# Altium footprint library STM32F0.PcbLib: 228 footprints (part 12 of 16)
Each footprint in its own frame and in the unit in brackets; x right, y up, seen from the top. Pads: shape width x height; smd on the part's side, far side on the other; paste and mask are expansions set on the pad; w line width, h text height; cw(c..) or ccw(c..) is an arc to the next point about the centre after c.
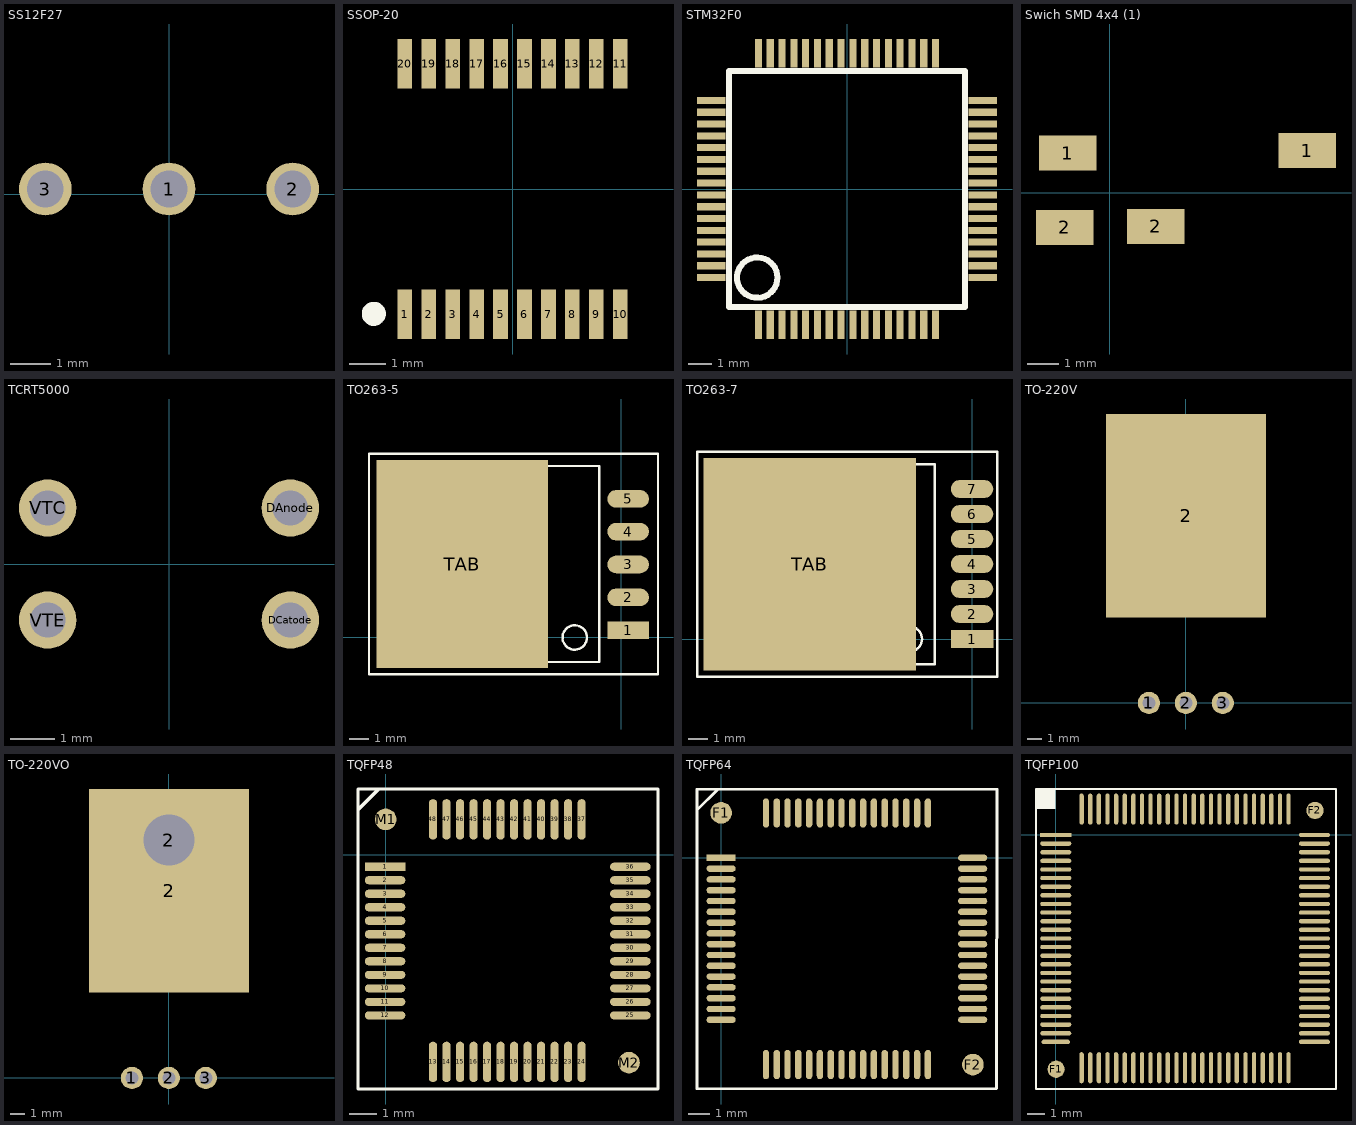
[diagram p11: the footprints below, top view; thin cyan lines are the x and y axes]

## SS12F27 [mm]
pads (3):
  round 1.3 hole 0.9: 1(0,0.127) 2(3.048,0.127) 3(-3.048,0.127)
3D body "User Library-SLIDE SWITCH SS12F23.STEP": height 5.75, standoff -3.35, extent -6.5,-12.138 6.5,0.762

## SSOP-20 [mm]
pads (20):
  rect 0.4x1.35 smd: 1(-2.925,-3.4) 2(-2.275,-3.4) 3(-1.625,-3.4) 4(-0.975,-3.4) 5(-0.325,-3.4) 6(0.325,-3.4) 7(0.975,-3.4) 8(1.625,-3.4) 9(2.275,-3.4) 10(2.925,-3.4) 11(2.925,3.4) 12(2.275,3.4) 13(1.625,3.4) 14(0.975,3.4) 15(0.325,3.4) 16(-0.325,3.4) 17(-0.975,3.4) 18(-1.625,3.4) 19(-2.275,3.4) 20(-2.925,3.4)
Top Overlay:
  circle w0.5: c-3.77,-3.39 r0.076
3D body "User Library-SSOP 20 PIN-1.step": height 1.78, standoff -0.21, extent -3.665,-3.95 3.665,3.95

## STM32F0 [mm]
pads (64):
  rect 0.3x1.2 smd: 1(-3.75,-5.75) 2(-3.25,-5.75) 3(-2.75,-5.75) 4(-2.25,-5.75) 5(-1.75,-5.75) 6(-1.25,-5.75) 7(-0.75,-5.75) 8(-0.25,-5.75) 9(0.25,-5.75) 10(0.75,-5.75) 11(1.25,-5.75) 12(1.75,-5.75) 13(2.25,-5.75) 14(2.75,-5.75) 15(3.25,-5.75) 16(3.75,-5.75) 33(3.75,5.75) 34(3.25,5.75) 35(2.75,5.75) 36(2.25,5.75) 37(1.75,5.75) 38(1.25,5.75) 39(0.75,5.75) 40(0.25,5.75) 41(-0.25,5.75) 42(-0.75,5.75) 43(-1.25,5.75) 44(-1.75,5.75) 45(-2.25,5.75) 46(-2.75,5.75) 47(-3.25,5.75) 48(-3.75,5.75)
  rect 1.2x0.3 smd: 17(5.75,-3.75) 18(5.75,-3.25) 19(5.75,-2.75) 20(5.75,-2.25) 21(5.75,-1.75) 22(5.75,-1.25) 23(5.75,-0.75) 24(5.75,-0.25) 25(5.75,0.25) 26(5.75,0.75) 27(5.75,1.25) 28(5.75,1.75) 29(5.75,2.25) 30(5.75,2.75) 31(5.75,3.25) 32(5.75,3.75) 49(-5.75,3.75) 50(-5.75,3.25) 51(-5.75,2.75) 52(-5.75,2.25) 53(-5.75,1.75) 54(-5.75,1.25) 55(-5.75,0.75) 56(-5.75,0.25) 57(-5.75,-0.25) 58(-5.75,-0.75) 59(-5.75,-1.25) 60(-5.75,-1.75) 61(-5.75,-2.25) 62(-5.75,-2.75) 63(-5.75,-3.25) 64(-5.75,-3.75)
Top Overlay:
  circle w0.254: c-3.8,-3.75 r0.854
  lines w0.254: -5,-5 5,-5 5,5 -5,5 -5,-5
3D body "User Library-LQFP64_Grid_0_5.STEP": height 1.6, standoff 0, extent -6,-6 6,6

## Swich SMD 4x4 (1) [mm]
pads (4):
  rect 1.8x1.1 smd: 1(-1.32,1.25) 1(6.2,1.33) 2(-1.42,-1.08) 2(1.44,-1.05)

## TCRT5000 [mm]
pads (4):
  round 1.3 hole 0.8: DAnode(2.75,1.27) DCatode(2.75,-1.27) VTC(-2.75,1.271) VTE(-2.75,-1.269)
3D body "User Library-TCRT-5000.STEP": height 6.5, standoff -25.41, extent -5.091,-2.898 5.209,2.902

## TO263-5 [mil]
pads (6):
  rect 85x36 smd: 1(14,15)
  oval 85x36 smd: 2(14,82) 3(14,149) 4(14,216) 5(14,283)
  rect 350x425 smd: TAB(-325,150)
Top Overlay:
  circle w5: c-95,0 r25
  lines w4: -45,-50 -451.54,-50 -470,10 -470,285 -445,350 -420,350 -45,350
  lines w5: -420,-50 -420,350 ; -395,-50 -395,350 ; -45,-50 -45,350 ; -515,-75 75,-75 75,375 -515,375 -515,-75
3D body: height 120, standoff 50, extent -393,-50 -82,350
3D body: height 101, standoff 0, extent -287,-49 -200,-17
3D body: height 100, standoff 0, extent -393,-50 -82,350
3D body: height 50, standoff 0, extent -472,-52 -393,350
3D body: height 60, standoff 40, extent -85,270 -5,295
3D body: height 60, standoff 0, extent -17,270 -5,295
3D body: height 20, standoff 0, extent -17,270 31,295
3D body: height 20, standoff 0, extent -17,205 31,230
3D body: height 60, standoff 0, extent -17,205 -5,230
3D body: height 60, standoff 40, extent -85,205 -5,230
3D body: height 20, standoff 0, extent -17,135 31,160
3D body: height 60, standoff 0, extent -17,135 -5,160
3D body: height 60, standoff 40, extent -85,135 -5,160
3D body: height 20, standoff 0, extent -17,70 31,95
3D body: height 60, standoff 0, extent -17,70 -5,95
3D body: height 60, standoff 40, extent -85,70 -5,95
3D body: height 20, standoff 0, extent -17,5 31,30
3D body: height 60, standoff 0, extent -17,5 -5,30
3D body: height 60, standoff 40, extent -85,5 -5,30

## TO263-7 [mil]
pads (8):
  rect 85x36 smd: 1(0,0)
  oval 85x36 smd: 2(0,50) 3(0,100) 4(0,150) 5(0,200) 6(0,250) 7(0,300)
  rect 425x425 smd: TAB(-325,150)
Top Overlay:
  circle w5: c-125,0 r25
  lines w5: -450,-50 -450,350 ; -425,-50 -425,350 ; -550,-75 50,-75 50,375 -550,375 -550,-75 ; -525,-25 -500,-50 -75,-50 -75,350 -500,350 -525,325 -525,-25
3D body: height 120, standoff 50, extent -423,-55 -112,345
3D body: height 101, standoff 0, extent -317,-54 -230,-22
3D body: height 100, standoff 0, extent -423,-55 -112,345
3D body: height 50, standoff 0, extent -502,-57 -423,345

## TO-220V [mil]
pads (4):
  round 60 hole 35.43: 1(-100,0) 2(0,0) 3(100,0)
  rect 433.07x551.18 smd: 2(0.38,506.63)
3D body "CircuitWorks-TO-220.step": height 165.35, standoff -118.11, extent -200,0 200,767.32

## TO-220VO [mm]
pads (5):
  round 1.524 hole 0.9: 1(-2.54,0) 2(0,0) 3(2.54,0)
  round 4.5 hole 3.5: 2(0.006,16.351)
  rect 11x14 smd: 2(0.01,12.868)
3D body "CircuitWorks-TO-220.step": height 4.2, standoff -3, extent -5.08,0 5.08,19.49

## TQFP48 [mm]
pads (50):
  rect 1.5x0.3 smd: 1(-0.025,-0.45)
  oval 1.5x0.3 smd: 2(-0.025,-0.95) 3(-0.025,-1.45) 4(-0.025,-1.95) 5(-0.025,-2.45) 6(-0.025,-2.95) 7(-0.025,-3.45) 8(-0.025,-3.95) 9(-0.025,-4.45) 10(-0.025,-4.95) 11(-0.025,-5.45) 12(-0.025,-5.95) 25(9.05,-5.95) 26(9.05,-5.45) 27(9.05,-4.95) 28(9.05,-4.45) 29(9.05,-3.95) 30(9.05,-3.45) 31(9.05,-2.95) 32(9.05,-2.45) 33(9.05,-1.95) 34(9.05,-1.45) 35(9.05,-0.95) 36(9.05,-0.45)
  oval 0.3x1.5 smd: 13(1.75,-7.675) 14(2.25,-7.675) 15(2.75,-7.675) 16(3.25,-7.675) 17(3.75,-7.675) 18(4.25,-7.675) 19(4.75,-7.675) 20(5.25,-7.675) 21(5.75,-7.675) 22(6.25,-7.675) 23(6.75,-7.675) 24(7.25,-7.675) 37(7.25,1.3) 38(6.75,1.3) 39(6.25,1.3) 40(5.75,1.3) 41(5.25,1.3) 42(4.75,1.3) 43(4.25,1.3) 44(3.75,1.3) 45(3.25,1.3) 46(2.75,1.3) 47(2.25,1.3) 48(1.75,1.3)
  round 0.8 smd: M1(0,1.3) M2(9,-7.7)
Top Overlay:
  lines w0.127: -1.025,1.525 -1.025,1.65 -0.25,2.425 ; -1.025,-8.675 10.075,-8.675 10.075,2.325 10.075,2.425 -1.025,2.425 -1.025,-8.675
3D body: height 0.76, standoff 0.38, extent 0.089,-6.071 0.914,-5.829
3D body: height 0.51, standoff 0, extent -0.254,-6.071 0.432,-5.829
3D body: height 0.97, standoff 0.13, extent 0.902,-6.744 8.141,0.419
3D body: height 0.51, standoff 0, extent -0.254,-5.556 0.432,-5.315
3D body: height 0.76, standoff 0.38, extent 0.089,-5.556 0.914,-5.315
3D body: height 0.51, standoff 0, extent -0.254,-5.074 0.432,-4.832
3D body: height 0.76, standoff 0.38, extent 0.089,-5.074 0.914,-4.832
3D body: height 0.51, standoff 0, extent -0.254,-4.566 0.432,-4.324
3D body: height 0.76, standoff 0.38, extent 0.089,-4.566 0.914,-4.324
3D body: height 0.51, standoff 0, extent -0.254,-4.083 0.432,-3.842
3D body: height 0.76, standoff 0.38, extent 0.089,-4.083 0.914,-3.842
3D body: height 0.51, standoff 0, extent -0.254,-3.575 0.432,-3.334
3D body: height 0.76, standoff 0.38, extent 0.089,-3.575 0.914,-3.334
3D body: height 0.51, standoff 0, extent -0.254,-3.067 0.432,-2.826
3D body: height 0.76, standoff 0.38, extent 0.089,-3.067 0.914,-2.826
3D body: height 0.51, standoff 0, extent -0.254,-2.584 0.432,-2.343
3D body: height 0.76, standoff 0.38, extent 0.089,-2.584 0.914,-2.343
3D body: height 0.51, standoff 0, extent -0.254,-2.076 0.432,-1.835
3D body: height 0.76, standoff 0.38, extent 0.089,-2.076 0.914,-1.835
3D body: height 0.51, standoff 0, extent -0.254,-1.568 0.432,-1.327
3D body: height 0.76, standoff 0.38, extent 0.089,-1.568 0.914,-1.327
3D body: height 0.51, standoff 0, extent -0.254,-1.086 0.432,-0.845
3D body: height 0.76, standoff 0.38, extent 0.089,-1.086 0.914,-0.845
3D body: height 0.51, standoff 0, extent -0.254,-0.578 0.432,-0.337
3D body: height 0.76, standoff 0.38, extent 0.089,-0.578 0.914,-0.337
3D body: height 0.76, standoff 0.38, extent 1.632,-7.556 1.873,-6.731
3D body: height 0.51, standoff 0, extent 1.632,-7.899 1.873,-7.214
3D body: height 0.76, standoff 0.38, extent 2.14,-7.556 2.381,-6.731
3D body: height 0.51, standoff 0, extent 2.14,-7.899 2.381,-7.214
3D body: height 0.76, standoff 0.38, extent 2.623,-7.556 2.864,-6.731
3D body: height 0.51, standoff 0, extent 2.623,-7.899 2.864,-7.214
3D body: height 0.76, standoff 0.38, extent 3.131,-7.556 3.372,-6.731
3D body: height 0.51, standoff 0, extent 3.131,-7.899 3.372,-7.214
3D body: height 0.76, standoff 0.38, extent 3.639,-7.556 3.88,-6.731
3D body: height 0.51, standoff 0, extent 3.639,-7.899 3.88,-7.214
3D body: height 0.76, standoff 0.38, extent 4.121,-7.556 4.362,-6.731
3D body: height 0.51, standoff 0, extent 4.121,-7.899 4.362,-7.214
3D body: height 0.76, standoff 0.38, extent 4.629,-7.556 4.87,-6.731
3D body: height 0.51, standoff 0, extent 4.629,-7.899 4.87,-7.214
3D body: height 0.76, standoff 0.38, extent 5.137,-7.556 5.378,-6.731
3D body: height 0.51, standoff 0, extent 5.137,-7.899 5.378,-7.214
3D body: height 0.76, standoff 0.38, extent 5.62,-7.556 5.861,-6.731
3D body: height 0.51, standoff 0, extent 5.62,-7.899 5.861,-7.214
3D body: height 0.76, standoff 0.38, extent 6.128,-7.556 6.369,-6.731
3D body: height 0.51, standoff 0, extent 6.128,-7.899 6.369,-7.214
3D body: height 0.76, standoff 0.38, extent 6.61,-7.556 6.852,-6.731
3D body: height 0.51, standoff 0, extent 6.61,-7.899 6.852,-7.214
3D body: height 0.51, standoff 0, extent 7.125,-7.899 7.366,-7.214
3D body: height 0.76, standoff 0.38, extent 7.125,-7.556 7.366,-6.731
3D body: height 0.76, standoff 0.38, extent 8.103,-6.064 8.928,-5.823
3D body: height 0.51, standoff 0, extent 8.585,-6.064 9.271,-5.823
3D body: height 0.76, standoff 0.38, extent 8.103,-5.556 8.928,-5.315
3D body: height 0.51, standoff 0, extent 8.585,-5.556 9.271,-5.315
3D body: height 0.76, standoff 0.38, extent 8.103,-5.074 8.928,-4.832
3D body: height 0.51, standoff 0, extent 8.585,-5.074 9.271,-4.832
3D body: height 0.76, standoff 0.38, extent 8.103,-4.566 8.928,-4.324
3D body: height 0.51, standoff 0, extent 8.585,-4.566 9.271,-4.324
3D body: height 0.76, standoff 0.38, extent 8.103,-4.058 8.928,-3.816
3D body: height 0.51, standoff 0, extent 8.585,-4.058 9.271,-3.816
3D body: height 0.76, standoff 0.38, extent 8.103,-3.575 8.928,-3.334
3D body: height 0.51, standoff 0, extent 8.585,-3.575 9.271,-3.334
3D body: height 0.76, standoff 0.38, extent 8.103,-3.067 8.928,-2.826
3D body: height 0.51, standoff 0, extent 8.585,-3.067 9.271,-2.826
3D body: height 0.76, standoff 0.38, extent 8.103,-2.559 8.928,-2.318
3D body: height 0.51, standoff 0, extent 8.585,-2.559 9.271,-2.318
3D body: height 0.76, standoff 0.38, extent 8.103,-2.076 8.928,-1.835
3D body: height 0.51, standoff 0, extent 8.585,-2.076 9.271,-1.835
3D body: height 0.76, standoff 0.38, extent 8.103,-1.568 8.928,-1.327
3D body: height 0.51, standoff 0, extent 8.585,-1.568 9.271,-1.327
3D body: height 0.76, standoff 0.38, extent 8.103,-1.086 8.928,-0.845
3D body: height 0.51, standoff 0, extent 8.585,-1.086 9.271,-0.845
3D body: height 0.51, standoff 0, extent 8.585,-0.572 9.271,-0.33
3D body: height 0.76, standoff 0.38, extent 8.103,-0.572 8.928,-0.33
3D body: height 0.76, standoff 0.38, extent 7.118,0.381 7.36,1.206
3D body: height 0.51, standoff 0, extent 7.118,0.864 7.36,1.549
3D body: height 0.76, standoff 0.38, extent 6.61,0.381 6.852,1.206
3D body: height 0.51, standoff 0, extent 6.61,0.864 6.852,1.549
3D body: height 0.76, standoff 0.38, extent 6.128,0.381 6.369,1.206
3D body: height 0.51, standoff 0, extent 6.128,0.864 6.369,1.549
3D body: height 0.76, standoff 0.38, extent 5.62,0.381 5.861,1.206
3D body: height 0.51, standoff 0, extent 5.62,0.864 5.861,1.549
3D body: height 0.76, standoff 0.38, extent 5.112,0.381 5.353,1.206
3D body: height 0.51, standoff 0, extent 5.112,0.864 5.353,1.549
3D body: height 0.76, standoff 0.38, extent 4.629,0.381 4.87,1.206
3D body: height 0.51, standoff 0, extent 4.629,0.864 4.87,1.549
3D body: height 0.76, standoff 0.38, extent 4.121,0.381 4.362,1.206
3D body: height 0.51, standoff 0, extent 4.121,0.864 4.362,1.549
3D body: height 0.76, standoff 0.38, extent 3.613,0.381 3.854,1.206
3D body: height 0.51, standoff 0, extent 3.613,0.864 3.854,1.549
3D body: height 0.76, standoff 0.38, extent 3.131,0.381 3.372,1.206
3D body: height 0.51, standoff 0, extent 3.131,0.864 3.372,1.549
3D body: height 0.76, standoff 0.38, extent 2.623,0.381 2.864,1.206
3D body: height 0.51, standoff 0, extent 2.623,0.864 2.864,1.549
3D body: height 0.76, standoff 0.38, extent 2.14,0.381 2.381,1.206
3D body: height 0.51, standoff 0, extent 2.14,0.864 2.381,1.549
3D body: height 0.51, standoff 0, extent 1.626,0.864 1.867,1.549
3D body: height 0.76, standoff 0.38, extent 1.626,0.381 1.867,1.206
3D body: height 0.99, standoff 0.25, extent 1.295,-0.483 1.801,0.024

## TQFP64 [mm]
pads (66):
  rect 1.35x0.295 smd: 1(0,0)
  oval 1.35x0.295 smd: 2(0,-0.5) 3(0,-1) 4(0,-1.5) 5(0,-2) 6(0,-2.5) 7(0,-3) 8(0,-3.5) 9(0,-4) 10(0,-4.5) 11(0,-5) 12(0,-5.5) 13(0,-6) 14(0,-6.5) 15(0,-7) 16(0,-7.5) 33(11.65,-7.5) 34(11.65,-7) 35(11.65,-6.5) 36(11.65,-6) 37(11.65,-5.5) 38(11.65,-5) 39(11.65,-4.5) 40(11.65,-4) 41(11.65,-3.5) 42(11.65,-3) 43(11.65,-2.5) 44(11.65,-2) 45(11.65,-1.5) 46(11.65,-1) 47(11.65,-0.5) 48(11.65,0)
  oval 0.295x1.35 smd: 17(2.075,-9.575) 18(2.575,-9.575) 19(3.075,-9.575) 20(3.575,-9.575) 21(4.075,-9.575) 22(4.575,-9.575) 23(5.075,-9.575) 24(5.575,-9.575) 25(6.075,-9.575) 26(6.575,-9.575) 27(7.075,-9.575) 28(7.575,-9.575) 29(8.075,-9.575) 30(8.575,-9.575) 31(9.075,-9.575) 32(9.575,-9.575) 49(9.575,2.075) 50(9.075,2.075) 51(8.575,2.075) 52(8.075,2.075) 53(7.575,2.075) 54(7.075,2.075) 55(6.575,2.075) 56(6.075,2.075) 57(5.575,2.075) 58(5.075,2.075) 59(4.575,2.075) 60(4.075,2.075) 61(3.575,2.075) 62(3.075,2.075) 63(2.575,2.075) 64(2.075,2.075)
  round 1 smd: F1(0,2.083) F2(11.659,-9.576)
Top Overlay:
  lines w0.127: -1.118,2.007 -1.118,2.21 -0.152,3.175 ; -1.118,-10.693 12.757,-10.682 12.776,3.175 -1.067,3.175 -1.118,3.175 -1.118,-10.693
3D body: height 0.99, standoff 0.25, extent 1.449,0.127 1.955,0.634
3D body: height 0.76, standoff 0.38, extent 0.14,-0.121 0.965,0.121
3D body: height 0.51, standoff 0, extent -0.203,-0.121 0.483,0.121
3D body: height 0.76, standoff 0.38, extent 0.14,-0.629 0.965,-0.387
3D body: height 0.51, standoff 0, extent -0.203,-0.629 0.483,-0.387
3D body: height 0.76, standoff 0.38, extent 0.14,-1.111 0.965,-0.87
3D body: height 0.51, standoff 0, extent -0.203,-1.111 0.483,-0.87
3D body: height 0.76, standoff 0.38, extent 0.14,-1.619 0.965,-1.378
3D body: height 0.51, standoff 0, extent -0.203,-1.619 0.483,-1.378
3D body: height 0.76, standoff 0.38, extent 0.14,-2.127 0.965,-1.886
3D body: height 0.51, standoff 0, extent -0.203,-2.127 0.483,-1.886
3D body: height 0.76, standoff 0.38, extent 0.14,-2.61 0.965,-2.369
3D body: height 0.51, standoff 0, extent -0.203,-2.61 0.483,-2.369
3D body: height 0.76, standoff 0.38, extent 0.14,-3.118 0.965,-2.877
3D body: height 0.51, standoff 0, extent -0.203,-3.118 0.483,-2.877
3D body: height 0.76, standoff 0.38, extent 0.14,-3.626 0.965,-3.385
3D body: height 0.51, standoff 0, extent -0.203,-3.626 0.483,-3.385
3D body: height 0.76, standoff 0.38, extent 0.14,-4.108 0.965,-3.867
3D body: height 0.51, standoff 0, extent -0.203,-4.108 0.483,-3.867
3D body: height 0.76, standoff 0.38, extent 0.14,-4.616 0.965,-4.375
3D body: height 0.51, standoff 0, extent -0.203,-4.616 0.483,-4.375
3D body: height 0.76, standoff 0.38, extent 0.14,-5.099 0.965,-4.858
3D body: height 0.51, standoff 0, extent -0.203,-5.099 0.483,-4.858
3D body: height 0.97, standoff 0.13, extent 0.94,-8.661 10.693,1.143
3D body: height 0.51, standoff 0, extent -0.203,-5.613 0.483,-5.372
3D body: height 0.76, standoff 0.38, extent 0.14,-5.613 0.965,-5.372
3D body: height 0.76, standoff 0.38, extent 0.14,-7.62 0.965,-7.379
3D body: height 0.51, standoff 0, extent -0.203,-7.62 0.483,-7.379
3D body: height 0.51, standoff 0, extent -0.203,-7.106 0.483,-6.864
3D body: height 0.76, standoff 0.38, extent 0.14,-7.106 0.965,-6.864
3D body: height 0.51, standoff 0, extent -0.203,-6.623 0.483,-6.382
3D body: height 0.76, standoff 0.38, extent 0.14,-6.623 0.965,-6.382
3D body: height 0.51, standoff 0, extent -0.203,-6.115 0.483,-5.874
3D body: height 0.76, standoff 0.38, extent 0.14,-6.115 0.965,-5.874
3D body: height 0.76, standoff 0.38, extent 7.931,-9.461 8.172,-8.636
3D body: height 0.51, standoff 0, extent 7.931,-9.804 8.172,-9.119
3D body: height 0.76, standoff 0.38, extent 8.439,-9.461 8.68,-8.636
3D body: height 0.51, standoff 0, extent 8.439,-9.804 8.68,-9.119
3D body: height 0.76, standoff 0.38, extent 8.922,-9.461 9.163,-8.636
3D body: height 0.51, standoff 0, extent 8.922,-9.804 9.163,-9.119
3D body: height 0.51, standoff 0, extent 9.436,-9.804 9.677,-9.119
3D body: height 0.76, standoff 0.38, extent 9.436,-9.461 9.677,-8.636
3D body: height 0.76, standoff 0.38, extent 7.429,-9.461 7.671,-8.636
3D body: height 0.51, standoff 0, extent 7.429,-9.804 7.671,-9.119
3D body: height 0.51, standoff 0, extent 6.915,-9.804 7.156,-9.119
3D body: height 0.76, standoff 0.38, extent 6.915,-9.461 7.156,-8.636
3D body: height 0.51, standoff 0, extent 6.433,-9.804 6.674,-9.119
3D body: height 0.76, standoff 0.38, extent 6.433,-9.461 6.674,-8.636
3D body: height 0.51, standoff 0, extent 5.925,-9.804 6.166,-9.119
3D body: height 0.76, standoff 0.38, extent 5.925,-9.461 6.166,-8.636
3D body: height 0.51, standoff 0, extent 5.442,-9.804 5.683,-9.119
3D body: height 0.76, standoff 0.38, extent 5.442,-9.461 5.683,-8.636
3D body: height 0.51, standoff 0, extent 4.934,-9.804 5.175,-9.119
3D body: height 0.76, standoff 0.38, extent 4.934,-9.461 5.175,-8.636
3D body: height 0.51, standoff 0, extent 4.426,-9.804 4.667,-9.119
3D body: height 0.76, standoff 0.38, extent 4.426,-9.461 4.667,-8.636
3D body: height 0.51, standoff 0, extent 3.943,-9.804 4.185,-9.119
3D body: height 0.76, standoff 0.38, extent 3.943,-9.461 4.185,-8.636
3D body: height 0.51, standoff 0, extent 3.435,-9.804 3.677,-9.119
3D body: height 0.76, standoff 0.38, extent 3.435,-9.461 3.677,-8.636
3D body: height 0.51, standoff 0, extent 2.927,-9.804 3.169,-9.119
3D body: height 0.76, standoff 0.38, extent 2.927,-9.461 3.169,-8.636
3D body: height 0.51, standoff 0, extent 2.445,-9.804 2.686,-9.119
3D body: height 0.76, standoff 0.38, extent 2.445,-9.461 2.686,-8.636
3D body: height 0.51, standoff 0, extent 1.937,-9.804 2.178,-9.119
3D body: height 0.76, standoff 0.38, extent 1.937,-9.461 2.178,-8.636
3D body: height 0.76, standoff 0.38, extent 10.668,-1.619 11.493,-1.378
3D body: height 0.51, standoff 0, extent 11.151,-1.619 11.836,-1.378
3D body: height 0.76, standoff 0.38, extent 10.668,-1.111 11.493,-0.87
3D body: height 0.51, standoff 0, extent 11.151,-1.111 11.836,-0.87
3D body: height 0.76, standoff 0.38, extent 10.668,-0.629 11.493,-0.387
3D body: height 0.51, standoff 0, extent 11.151,-0.629 11.836,-0.387
3D body: height 0.51, standoff 0, extent 11.151,-0.114 11.836,0.127
3D body: height 0.76, standoff 0.38, extent 10.668,-0.114 11.493,0.127
3D body: height 0.76, standoff 0.38, extent 10.668,-2.121 11.493,-1.88
3D body: height 0.51, standoff 0, extent 11.151,-2.121 11.836,-1.88
3D body: height 0.51, standoff 0, extent 11.151,-2.635 11.836,-2.394
3D body: height 0.76, standoff 0.38, extent 10.668,-2.635 11.493,-2.394
3D body: height 0.51, standoff 0, extent 11.151,-3.118 11.836,-2.877
3D body: height 0.76, standoff 0.38, extent 10.668,-3.118 11.493,-2.877
3D body: height 0.51, standoff 0, extent 11.151,-3.626 11.836,-3.385
3D body: height 0.76, standoff 0.38, extent 10.668,-3.626 11.493,-3.385
3D body: height 0.51, standoff 0, extent 11.151,-4.108 11.836,-3.867
3D body: height 0.76, standoff 0.38, extent 10.668,-4.108 11.493,-3.867
3D body: height 0.51, standoff 0, extent 11.151,-4.616 11.836,-4.375
3D body: height 0.76, standoff 0.38, extent 10.668,-4.616 11.493,-4.375
3D body: height 0.51, standoff 0, extent 11.151,-5.124 11.836,-4.883
3D body: height 0.76, standoff 0.38, extent 10.668,-5.124 11.493,-4.883
3D body: height 0.51, standoff 0, extent 11.151,-5.607 11.836,-5.366
3D body: height 0.76, standoff 0.38, extent 10.668,-5.607 11.493,-5.366
3D body: height 0.51, standoff 0, extent 11.151,-6.115 11.836,-5.874
3D body: height 0.76, standoff 0.38, extent 10.668,-6.115 11.493,-5.874
3D body: height 0.51, standoff 0, extent 11.151,-6.623 11.836,-6.382
3D body: height 0.76, standoff 0.38, extent 10.668,-6.623 11.493,-6.382
3D body: height 0.51, standoff 0, extent 11.151,-7.106 11.836,-6.864
3D body: height 0.76, standoff 0.38, extent 10.668,-7.106 11.493,-6.864
3D body: height 0.51, standoff 0, extent 11.151,-7.614 11.836,-7.372
3D body: height 0.76, standoff 0.38, extent 10.668,-7.614 11.493,-7.372
3D body: height 0.76, standoff 0.38, extent 3.461,1.118 3.702,1.943
3D body: height 0.51, standoff 0, extent 3.461,1.6 3.702,2.286
3D body: height 0.76, standoff 0.38, extent 2.953,1.118 3.194,1.943
3D body: height 0.51, standoff 0, extent 2.953,1.6 3.194,2.286
3D body: height 0.76, standoff 0.38, extent 2.47,1.118 2.711,1.943
3D body: height 0.51, standoff 0, extent 2.47,1.6 2.711,2.286
3D body: height 0.51, standoff 0, extent 1.956,1.6 2.197,2.286
3D body: height 0.76, standoff 0.38, extent 1.956,1.118 2.197,1.943
3D body: height 0.76, standoff 0.38, extent 3.962,1.118 4.204,1.943
3D body: height 0.51, standoff 0, extent 3.962,1.6 4.204,2.286
3D body: height 0.51, standoff 0, extent 4.477,1.6 4.718,2.286
3D body: height 0.76, standoff 0.38, extent 4.477,1.118 4.718,1.943
3D body: height 0.51, standoff 0, extent 4.959,1.6 5.201,2.286
3D body: height 0.76, standoff 0.38, extent 4.959,1.118 5.201,1.943
3D body: height 0.51, standoff 0, extent 5.467,1.6 5.709,2.286
3D body: height 0.76, standoff 0.38, extent 5.467,1.118 5.709,1.943
3D body: height 0.51, standoff 0, extent 5.95,1.6 6.191,2.286
3D body: height 0.76, standoff 0.38, extent 5.95,1.118 6.191,1.943
3D body: height 0.51, standoff 0, extent 6.458,1.6 6.699,2.286
3D body: height 0.76, standoff 0.38, extent 6.458,1.118 6.699,1.943
3D body: height 0.51, standoff 0, extent 6.966,1.6 7.207,2.286
3D body: height 0.76, standoff 0.38, extent 6.966,1.118 7.207,1.943
3D body: height 0.51, standoff 0, extent 7.449,1.6 7.69,2.286
3D body: height 0.76, standoff 0.38, extent 7.449,1.118 7.69,1.943
3D body: height 0.51, standoff 0, extent 7.957,1.6 8.198,2.286
3D body: height 0.76, standoff 0.38, extent 7.957,1.118 8.198,1.943
3D body: height 0.51, standoff 0, extent 8.465,1.6 8.706,2.286
3D body: height 0.76, standoff 0.38, extent 8.465,1.118 8.706,1.943
3D body: height 0.51, standoff 0, extent 8.947,1.6 9.188,2.286
3D body: height 0.76, standoff 0.38, extent 8.947,1.118 9.188,1.943
3D body: height 0.51, standoff 0, extent 9.455,1.6 9.696,2.286
3D body: height 0.76, standoff 0.38, extent 9.455,1.118 9.696,1.943

## TQFP100 [mm]
pads (102):
  rect 1.8x0.25 smd: 1(0,0)
  oval 1.8x0.25 smd: 2(0,-0.5) 3(0,-1) 4(0,-1.5) 5(0,-2) 6(0,-2.5) 7(0,-3) 8(0,-3.5) 9(0,-4) 10(0,-4.5) 11(0,-5) 12(0,-5.5) 13(0,-6) 14(0,-6.5) 15(0,-7) 16(0,-7.5) 17(0,-8) 18(0,-8.5) 19(0,-9) 20(0,-9.5) 21(0,-10) 22(0,-10.5) 23(0,-11) 24(0,-11.5) 51(15,-12) 52(15,-11.5) 53(15,-11) 54(15,-10.5) 55(15,-10) 56(15,-9.5) 57(15,-9) 58(15,-8.5) 59(15,-8) 60(15,-7.5) 61(15,-7) 62(15,-6.5) 63(15,-6) 64(15,-5.5) 65(15,-5) 66(15,-4.5) 67(15,-4) 68(15,-3.5) 69(15,-3) 70(15,-2.5) 71(15,-2) 72(15,-1.5) 73(15,-1) 74(15,-0.5) 75(15,0)
  oval 1.651x0.25 smd: 25(0,-12)
  oval 0.25x1.8 smd: 26(1.5,-13.5) 27(2,-13.5) 28(2.5,-13.5) 29(3,-13.5) 30(3.5,-13.5) 31(4,-13.5) 32(4.5,-13.5) 33(5,-13.5) 34(5.5,-13.5) 35(6,-13.5) 36(6.5,-13.5) 37(7,-13.5) 38(7.5,-13.5) 39(8,-13.5) 40(8.5,-13.5) 41(9,-13.5) 42(9.5,-13.5) 43(10,-13.5) 44(10.5,-13.5) 45(11,-13.5) 46(11.5,-13.5) 47(12,-13.5) 48(12.5,-13.5) 49(13,-13.5) 50(13.5,-13.5) 76(13.5,1.5) 77(13,1.5) 78(12.5,1.5) 79(12,1.5) 80(11.5,1.5) 81(11,1.5) 82(10.5,1.5) 83(10,1.5) 84(9.5,1.5) 85(9,1.5) 86(8.5,1.5) 87(8,1.5) 88(7.5,1.5) 89(7,1.5) 90(6.5,1.5) 91(6,1.5) 92(5.5,1.5) 93(5,1.5) 94(4.5,1.5) 95(4,1.5) 96(3.5,1.5) 97(3,1.5) 98(2.5,1.5) 99(2,1.5) 100(1.5,1.5)
  round 1 smd: F1(0.022,-13.586) F2(15.033,1.425)
Top Overlay:
  rectangle: -1.146,1.499 -0.025,2.667
  lines w0.127: -0.511,2.667 -1.146,2.032 -1.146,2.159 -0.638,2.667 -0.765,2.667 -1.146,2.286 -1.146,2.413 -0.892,2.667 -1.146,2.667 ; -1.146,2.667 16.253,2.667 16.253,-14.732 -1.146,-14.732 -1.146,2.667
3D body: height 0.3, standoff 0, extent 13.353,1.191 13.658,1.75
3D body: height 0.64, standoff 0.3, extent 13.353,0.582 13.658,1.407
3D body: height 0.3, standoff 0, extent 10.353,1.191 10.658,1.75
3D body: height 0.64, standoff 0.3, extent 10.353,0.582 10.658,1.407
3D body: height 0.3, standoff 0, extent 10.853,1.191 11.158,1.75
3D body: height 0.64, standoff 0.3, extent 10.853,0.582 11.158,1.407
3D body: height 0.3, standoff 0, extent 11.353,1.191 11.658,1.75
3D body: height 0.64, standoff 0.3, extent 11.353,0.582 11.658,1.407
3D body: height 0.3, standoff 0, extent 11.853,1.191 12.158,1.75
3D body: height 0.64, standoff 0.3, extent 11.853,0.582 12.158,1.407
3D body: height 0.3, standoff 0, extent 12.353,1.191 12.658,1.75
3D body: height 0.64, standoff 0.3, extent 12.353,0.582 12.658,1.407
3D body: height 0.64, standoff 0.3, extent 12.853,0.582 13.158,1.407
3D body: height 0.3, standoff 0, extent 12.853,1.191 13.158,1.75
3D body: height 0.3, standoff 0, extent 7.353,1.191 7.658,1.75
3D body: height 0.64, standoff 0.3, extent 7.353,0.582 7.658,1.407
3D body: height 0.3, standoff 0, extent 7.853,1.191 8.158,1.75
3D body: height 0.64, standoff 0.3, extent 7.853,0.582 8.158,1.407
3D body: height 0.3, standoff 0, extent 8.353,1.191 8.658,1.75
3D body: height 0.64, standoff 0.3, extent 8.353,0.582 8.658,1.407
3D body: height 0.3, standoff 0, extent 8.853,1.191 9.158,1.75
3D body: height 0.64, standoff 0.3, extent 8.853,0.582 9.158,1.407
3D body: height 0.3, standoff 0, extent 9.353,1.191 9.658,1.75
3D body: height 0.64, standoff 0.3, extent 9.353,0.582 9.658,1.407
3D body: height 0.64, standoff 0.3, extent 9.853,0.582 10.158,1.407
3D body: height 0.3, standoff 0, extent 9.853,1.191 10.158,1.75
3D body: height 0.3, standoff 0, extent 4.353,1.191 4.658,1.75
3D body: height 0.64, standoff 0.3, extent 4.353,0.582 4.658,1.407
3D body: height 0.3, standoff 0, extent 4.853,1.191 5.158,1.75
3D body: height 0.64, standoff 0.3, extent 4.853,0.582 5.158,1.407
3D body: height 0.3, standoff 0, extent 5.353,1.191 5.658,1.75
3D body: height 0.64, standoff 0.3, extent 5.353,0.582 5.658,1.407
3D body: height 0.3, standoff 0, extent 5.853,1.191 6.158,1.75
3D body: height 0.64, standoff 0.3, extent 5.853,0.582 6.158,1.407
3D body: height 0.3, standoff 0, extent 6.353,1.191 6.658,1.75
3D body: height 0.64, standoff 0.3, extent 6.353,0.582 6.658,1.407
3D body: height 0.64, standoff 0.3, extent 6.853,0.582 7.158,1.407
3D body: height 0.3, standoff 0, extent 6.853,1.191 7.158,1.75
3D body: height 0.3, standoff 0, extent 1.353,1.191 1.658,1.75
3D body: height 0.64, standoff 0.3, extent 1.353,0.582 1.658,1.407
3D body: height 0.3, standoff 0, extent 1.853,1.191 2.158,1.75
3D body: height 0.64, standoff 0.3, extent 1.853,0.582 2.158,1.407
3D body: height 0.3, standoff 0, extent 2.353,1.191 2.658,1.75
3D body: height 0.64, standoff 0.3, extent 2.353,0.582 2.658,1.407
3D body: height 0.3, standoff 0, extent 2.853,1.191 3.158,1.75
3D body: height 0.64, standoff 0.3, extent 2.853,0.582 3.158,1.407
3D body: height 0.3, standoff 0, extent 3.353,1.191 3.658,1.75
3D body: height 0.64, standoff 0.3, extent 3.353,0.582 3.658,1.407
3D body: height 0.64, standoff 0.3, extent 3.853,0.582 4.158,1.407
3D body: height 0.3, standoff 0, extent 3.853,1.191 4.158,1.75
3D body: height 0.3, standoff 0, extent 14.675,-12.162 15.234,-11.857
3D body: height 0.64, standoff 0.3, extent 14.066,-12.162 14.891,-11.857
3D body: height 0.3, standoff 0, extent 14.675,-9.162 15.234,-8.857
3D body: height 0.64, standoff 0.3, extent 14.066,-9.162 14.891,-8.857
3D body: height 0.3, standoff 0, extent 14.675,-9.662 15.234,-9.357
3D body: height 0.64, standoff 0.3, extent 14.066,-9.662 14.891,-9.357
3D body: height 0.3, standoff 0, extent 14.675,-10.162 15.234,-9.857
3D body: height 0.64, standoff 0.3, extent 14.066,-10.162 14.891,-9.857
3D body: height 0.3, standoff 0, extent 14.675,-10.662 15.234,-10.357
3D body: height 0.64, standoff 0.3, extent 14.066,-10.662 14.891,-10.357
3D body: height 0.3, standoff 0, extent 14.675,-11.162 15.234,-10.857
3D body: height 0.64, standoff 0.3, extent 14.066,-11.162 14.891,-10.857
3D body: height 0.64, standoff 0.3, extent 14.066,-11.662 14.891,-11.357
3D body: height 0.3, standoff 0, extent 14.675,-11.662 15.234,-11.357
3D body: height 0.3, standoff 0, extent 14.675,-6.162 15.234,-5.857
3D body: height 0.64, standoff 0.3, extent 14.066,-6.162 14.891,-5.857
3D body: height 0.3, standoff 0, extent 14.675,-6.662 15.234,-6.357
3D body: height 0.64, standoff 0.3, extent 14.066,-6.662 14.891,-6.357
3D body: height 0.3, standoff 0, extent 14.675,-7.162 15.234,-6.857
3D body: height 0.64, standoff 0.3, extent 14.066,-7.162 14.891,-6.857
3D body: height 0.3, standoff 0, extent 14.675,-7.662 15.234,-7.357
3D body: height 0.64, standoff 0.3, extent 14.066,-7.662 14.891,-7.357
3D body: height 0.3, standoff 0, extent 14.675,-8.162 15.234,-7.857
3D body: height 0.64, standoff 0.3, extent 14.066,-8.162 14.891,-7.857
3D body: height 0.64, standoff 0.3, extent 14.066,-8.662 14.891,-8.357
3D body: height 0.3, standoff 0, extent 14.675,-8.662 15.234,-8.357
3D body: height 0.3, standoff 0, extent 14.675,-3.162 15.234,-2.857
3D body: height 0.64, standoff 0.3, extent 14.066,-3.162 14.891,-2.857
3D body: height 0.3, standoff 0, extent 14.675,-3.662 15.234,-3.357
3D body: height 0.64, standoff 0.3, extent 14.066,-3.662 14.891,-3.357
3D body: height 0.3, standoff 0, extent 14.675,-4.162 15.234,-3.857
3D body: height 0.64, standoff 0.3, extent 14.066,-4.162 14.891,-3.857
3D body: height 0.3, standoff 0, extent 14.675,-4.662 15.234,-4.357
3D body: height 0.64, standoff 0.3, extent 14.066,-4.662 14.891,-4.357
3D body: height 0.3, standoff 0, extent 14.675,-5.162 15.234,-4.857
3D body: height 0.64, standoff 0.3, extent 14.066,-5.162 14.891,-4.857
3D body: height 0.64, standoff 0.3, extent 14.066,-5.662 14.891,-5.357
3D body: height 0.3, standoff 0, extent 14.675,-5.662 15.234,-5.357
3D body: height 0.3, standoff 0, extent 14.675,-0.162 15.234,0.143
3D body: height 0.64, standoff 0.3, extent 14.066,-0.162 14.891,0.143
3D body: height 0.3, standoff 0, extent 14.675,-0.662 15.234,-0.357
3D body: height 0.64, standoff 0.3, extent 14.066,-0.662 14.891,-0.357
3D body: height 0.3, standoff 0, extent 14.675,-1.162 15.234,-0.857
3D body: height 0.64, standoff 0.3, extent 14.066,-1.162 14.891,-0.857
3D body: height 0.3, standoff 0, extent 14.675,-1.662 15.234,-1.357
3D body: height 0.64, standoff 0.3, extent 14.066,-1.662 14.891,-1.357
3D body: height 0.3, standoff 0, extent 14.675,-2.162 15.234,-1.857
3D body: height 0.64, standoff 0.3, extent 14.066,-2.162 14.891,-1.857
3D body: height 0.64, standoff 0.3, extent 14.066,-2.662 14.891,-2.357
3D body: height 0.3, standoff 0, extent 14.675,-2.662 15.234,-2.357
3D body: height 0.3, standoff 0, extent 1.334,-13.738 1.639,-13.179
3D body: height 0.64, standoff 0.3, extent 1.334,-13.395 1.639,-12.57
3D body: height 0.64, standoff 0.3, extent 1.834,-13.395 2.139,-12.57
3D body: height 0.3, standoff 0, extent 1.834,-13.738 2.139,-13.179
3D body: height 0.64, standoff 0.3, extent 2.334,-13.395 2.639,-12.57
3D body: height 0.3, standoff 0, extent 2.334,-13.738 2.639,-13.179
3D body: height 0.64, standoff 0.3, extent 2.834,-13.395 3.139,-12.57
3D body: height 0.3, standoff 0, extent 2.834,-13.738 3.139,-13.179
3D body: height 0.64, standoff 0.3, extent 3.334,-13.395 3.639,-12.57
3D body: height 0.3, standoff 0, extent 3.334,-13.738 3.639,-13.179
3D body: height 0.64, standoff 0.3, extent 3.834,-13.395 4.139,-12.57
3D body: height 0.3, standoff 0, extent 3.834,-13.738 4.139,-13.179
3D body: height 0.3, standoff 0, extent 6.834,-13.738 7.139,-13.179
3D body: height 0.64, standoff 0.3, extent 6.834,-13.395 7.139,-12.57
3D body: height 0.3, standoff 0, extent 6.334,-13.738 6.639,-13.179
3D body: height 0.64, standoff 0.3, extent 6.334,-13.395 6.639,-12.57
3D body: height 0.3, standoff 0, extent 5.834,-13.738 6.139,-13.179
3D body: height 0.64, standoff 0.3, extent 5.834,-13.395 6.139,-12.57
3D body: height 0.3, standoff 0, extent 5.334,-13.738 5.639,-13.179
3D body: height 0.64, standoff 0.3, extent 5.334,-13.395 5.639,-12.57
3D body: height 0.3, standoff 0, extent 4.834,-13.738 5.139,-13.179
3D body: height 0.64, standoff 0.3, extent 4.834,-13.395 5.139,-12.57
3D body: height 0.64, standoff 0.3, extent 4.334,-13.395 4.639,-12.57
3D body: height 0.3, standoff 0, extent 4.334,-13.738 4.639,-13.179
3D body: height 0.3, standoff 0, extent 9.834,-13.738 10.139,-13.179
3D body: height 0.64, standoff 0.3, extent 9.834,-13.395 10.139,-12.57
3D body: height 0.3, standoff 0, extent 9.334,-13.738 9.639,-13.179
3D body: height 0.64, standoff 0.3, extent 9.334,-13.395 9.639,-12.57
3D body: height 0.3, standoff 0, extent 8.834,-13.738 9.139,-13.179
3D body: height 0.64, standoff 0.3, extent 8.834,-13.395 9.139,-12.57
3D body: height 0.3, standoff 0, extent 8.334,-13.738 8.639,-13.179
3D body: height 0.64, standoff 0.3, extent 8.334,-13.395 8.639,-12.57
3D body: height 0.3, standoff 0, extent 7.834,-13.738 8.139,-13.179
3D body: height 0.64, standoff 0.3, extent 7.834,-13.395 8.139,-12.57
3D body: height 0.64, standoff 0.3, extent 7.334,-13.395 7.639,-12.57
3D body: height 0.3, standoff 0, extent 7.334,-13.738 7.639,-13.179
3D body: height 0.3, standoff 0, extent 12.834,-13.738 13.139,-13.179
3D body: height 0.64, standoff 0.3, extent 12.834,-13.395 13.139,-12.57
3D body: height 0.3, standoff 0, extent 12.334,-13.738 12.639,-13.179
3D body: height 0.64, standoff 0.3, extent 12.334,-13.395 12.639,-12.57
3D body: height 0.3, standoff 0, extent 11.834,-13.738 12.139,-13.179
3D body: height 0.64, standoff 0.3, extent 11.834,-13.395 12.139,-12.57
3D body: height 0.3, standoff 0, extent 11.334,-13.738 11.639,-13.179
3D body: height 0.64, standoff 0.3, extent 11.334,-13.395 11.639,-12.57
3D body: height 0.3, standoff 0, extent 10.834,-13.738 11.139,-13.179
3D body: height 0.64, standoff 0.3, extent 10.834,-13.395 11.139,-12.57
3D body: height 0.64, standoff 0.3, extent 10.334,-13.395 10.639,-12.57
3D body: height 0.3, standoff 0, extent 10.334,-13.738 10.639,-13.179
3D body: height 0.64, standoff 0.3, extent 13.334,-13.395 13.639,-12.57
3D body: height 0.3, standoff 0, extent 13.334,-13.738 13.639,-13.179
3D body: height 0.3, standoff 0, extent -0.254,-12.143 0.305,-11.838
3D body: height 0.64, standoff 0.3, extent 0.089,-12.143 0.914,-11.838
3D body: height 0.3, standoff 0, extent -0.254,-9.143 0.305,-8.838
3D body: height 0.64, standoff 0.3, extent 0.089,-9.143 0.914,-8.838
3D body: height 0.64, standoff 0.3, extent 0.089,-9.643 0.914,-9.338
3D body: height 0.3, standoff 0, extent -0.254,-9.643 0.305,-9.338
3D body: height 0.64, standoff 0.3, extent 0.089,-10.143 0.914,-9.838
3D body: height 0.3, standoff 0, extent -0.254,-10.143 0.305,-9.838
3D body: height 0.64, standoff 0.3, extent 0.089,-10.643 0.914,-10.338
3D body: height 0.3, standoff 0, extent -0.254,-10.643 0.305,-10.338
3D body: height 0.64, standoff 0.3, extent 0.089,-11.143 0.914,-10.838
3D body: height 0.3, standoff 0, extent -0.254,-11.143 0.305,-10.838
3D body: height 0.64, standoff 0.3, extent 0.089,-11.643 0.914,-11.338
3D body: height 0.3, standoff 0, extent -0.254,-11.643 0.305,-11.338
3D body: height 0.3, standoff 0, extent -0.254,-6.143 0.305,-5.838
3D body: height 0.64, standoff 0.3, extent 0.089,-6.143 0.914,-5.838
3D body: height 0.64, standoff 0.3, extent 0.089,-6.643 0.914,-6.338
3D body: height 0.3, standoff 0, extent -0.254,-6.643 0.305,-6.338
3D body: height 0.64, standoff 0.3, extent 0.089,-7.143 0.914,-6.838
3D body: height 0.3, standoff 0, extent -0.254,-7.143 0.305,-6.838
3D body: height 0.64, standoff 0.3, extent 0.089,-7.643 0.914,-7.338
3D body: height 0.3, standoff 0, extent -0.254,-7.643 0.305,-7.338
3D body: height 0.64, standoff 0.3, extent 0.089,-8.143 0.914,-7.838
3D body: height 0.3, standoff 0, extent -0.254,-8.143 0.305,-7.838
3D body: height 0.64, standoff 0.3, extent 0.089,-8.643 0.914,-8.338
3D body: height 0.3, standoff 0, extent -0.254,-8.643 0.305,-8.338
3D body: height 0.3, standoff 0, extent -0.254,-3.143 0.305,-2.838
3D body: height 0.64, standoff 0.3, extent 0.089,-3.143 0.914,-2.838
3D body: height 0.64, standoff 0.3, extent 0.089,-3.643 0.914,-3.338
3D body: height 0.3, standoff 0, extent -0.254,-3.643 0.305,-3.338
3D body: height 0.64, standoff 0.3, extent 0.089,-4.143 0.914,-3.838
3D body: height 0.3, standoff 0, extent -0.254,-4.143 0.305,-3.838
3D body: height 0.64, standoff 0.3, extent 0.089,-4.643 0.914,-4.338
3D body: height 0.3, standoff 0, extent -0.254,-4.643 0.305,-4.338
3D body: height 0.64, standoff 0.3, extent 0.089,-5.143 0.914,-4.838
3D body: height 0.3, standoff 0, extent -0.254,-5.143 0.305,-4.838
3D body: height 0.64, standoff 0.3, extent 0.089,-5.643 0.914,-5.338
3D body: height 0.3, standoff 0, extent -0.254,-5.643 0.305,-5.338
3D body: height 0.3, standoff 0, extent -0.254,-2.643 0.305,-2.338
3D body: height 0.64, standoff 0.3, extent 0.089,-2.643 0.914,-2.338
3D body: height 0.3, standoff 0, extent -0.254,-2.143 0.305,-1.838
3D body: height 0.64, standoff 0.3, extent 0.089,-2.143 0.914,-1.838
3D body: height 0.3, standoff 0, extent -0.254,-1.643 0.305,-1.338
3D body: height 0.64, standoff 0.3, extent 0.089,-1.643 0.914,-1.338
3D body: height 0.3, standoff 0, extent -0.254,-1.143 0.305,-0.838
3D body: height 0.64, standoff 0.3, extent 0.089,-1.143 0.914,-0.838
3D body: height 0.3, standoff 0, extent -0.254,-0.643 0.305,-0.338
3D body: height 0.64, standoff 0.3, extent 0.089,-0.643 0.914,-0.338
3D body: height 0.64, standoff 0.3, extent 0.089,-0.143 0.914,0.162
3D body: height 0.3, standoff 0, extent -0.254,-0.143 0.305,0.162
3D body: height 1.02, standoff 0, extent 0.889,-12.598 14.097,0.61